# Altium footprint library SparkFun-Retired.PCBLIB: 302 footprints (part 17 of 19)
Each footprint in its own frame and in the unit in brackets; x right, y up, seen from the top. Pads: shape width x height; smd on the part's side, far side on the other; paste and mask are expansions set on the pad; w line width, h text height; cw(c..) or ccw(c..) is an arc to the next point about the centre after c.
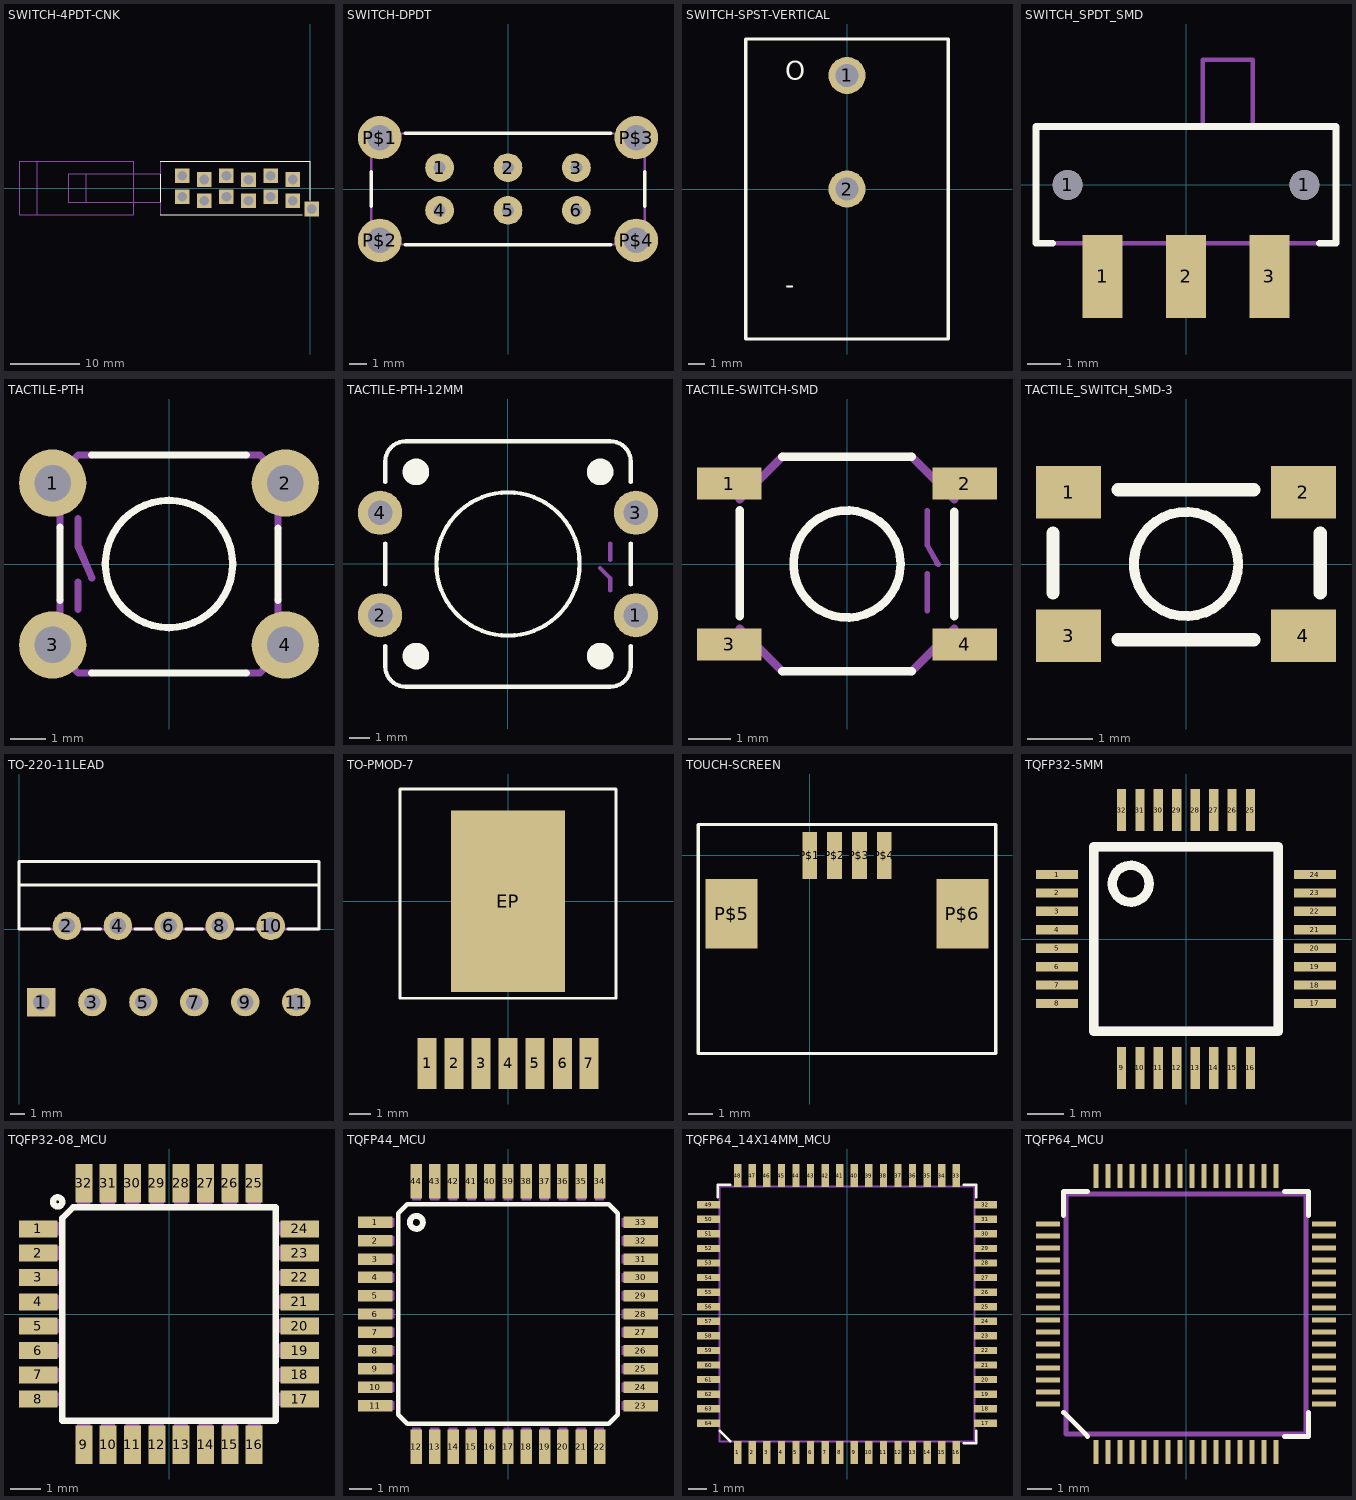
[diagram p16: the footprints below, top view; thin cyan lines are the x and y axes]

## SWITCH-4PDT-CNK [mil]
pads (13):
  rect 82.68x82.68 hole 55.12: P$13(8,-118) PP$1(-725,-49) PP$2(-600,-71) PP$3(-475,-49) PP$4(-350,-71) PP$5(-225,-49) PP$6(-100,-71) PP$7(-725,71) PP$8(-600,49) PP$9(-475,71) PP$10(-350,47) PP$11(-225,71) PP$12(-100,49)
Top Overlay:
  lines w5: -850,-150 -46,-150 ; -850,-79 -850,79 ; -850,150 0,150 0,-67
Mechanical 14:
  lines w5: -1272,-79 -1271,-79 ; -850,-150 -850,-79 ; -850,79 -850,150
Mechanical 16:
  rectangle: -745.9,-71.6 -704.9,-48.6
  rectangle: -620.5,-71.6 -579.5,-48.6
  rectangle: -495.1,-71.6 -454.1,-48.6
  rectangle: -369.7,-71.6 -328.7,-48.6
  rectangle: -244.3,-71.6 -203.3,-48.6
  rectangle: -118.9,-71.6 -77.9,-48.6
  rectangle: -745.9,47.9 -704.9,70.9
  rectangle: -620.5,47.9 -579.5,70.9
  rectangle: -495.1,47.9 -454.1,70.9
  rectangle: -369.7,47.9 -328.7,70.9
  rectangle: -244.3,47.9 -203.3,70.9
  rectangle: -118.9,47.9 -77.9,70.9
  region: 7.5,-138.5 7.5,-97.5 -15.5,-97.5 -15.5,-138.5
  lines w5: -1272,-79 -1272,79 ; -850,-79 -1271,-79 -1370,-79 -1370,79 -1272,79 ; -850,79 -1272,79 ; -1550,-150 -1550,150 ; -1550,-150 -1000,-150 -1000,150 -1550,150 ; -1550,-150 -1650,-150 -1650,150 -1550,150

## SWITCH-DPDT [mil]
pads (10):
  round 66 hole 27.56: 1(-157.48,49.21) 2(0,49.21) 3(157.48,49.21) 4(-157.48,-49.21) 5(0,-49.21) 6(157.48,-49.21)
  round 100 hole 59.06: P$1(-295.28,118.11) P$2(-295.28,-118.11) P$3(295.28,118.11) P$4(295.28,-118.11)
Top Overlay:
  lines w8: -314.96,-39.37 -314.96,39.37 ; -236.22,-127.95 236.22,-127.95 ; -236.22,127.95 236.22,127.95 ; 314.96,-39.37 314.96,39.37
Mechanical 16:
  lines w5: -314.96,-127.95 -314.96,127.95 314.96,127.95 314.96,-127.95 -314.96,-127.95

## SWITCH-SPST-VERTICAL [mil]
pads (2):
  round 90 hole 55.12: 1(0,275.59) 2(0,0)
Top Overlay:
  lines w8: -246.06,-364.17 246.06,-364.17 246.06,364.17 -246.06,364.17 -246.06,-364.17
  text "-" at -150,-270 h77.5
  text "O" at -150,250 h77.5
Mechanical 13:
  text "EG2578" at -150,-500 h77.5

## SWITCH_SPDT_SMD [mil]
pads (5):
  round 35.43 hole 35.43: 1(-139.76,0) 1(139.76,0)
  rect 47.24x98.43 smd: 1(-98.43,-108.27) 2(0,-108.27) 3(98.43,-108.27)
Top Overlay:
  lines w8: -157.48,-68.9 -177.17,-68.9 -177.17,68.9 177.17,68.9 177.17,-68.9 157.48,-68.9
Mechanical 16:
  lines w5: 19.69,68.9 78.74,68.9 ; 19.69,68.9 -177.17,68.9 -177.17,-68.9 177.17,-68.9 177.17,68.9 78.74,68.9 ; 19.69,68.9 19.69,147.64 78.74,147.64 78.74,68.9

## TACTILE-PTH [mil]
pads (4):
  round 74 hole 40: 1(-128,89) 2(128,89) 3(-128,-89) 4(128,-89)
Top Overlay:
  circle w8: c0,0 r70
  lines w8: -120,-40 -120,40.47 ; -85,-120 85,-120 ; -85,120 85,120 ; 120,-40 120,39.29
Mechanical 16:
  lines w8: -120,-40 -120,-100 -100,-120 -85,-120 ; -120,40 -120,100 -100,120 -85,120 ; -100,-50 -100,-20 ; -100,50 -100,20 -85,-15 ; 85,-120 100,-120 120,-100 120,-40 ; 85,120 100,120 120,100 120,40

## TACTILE-PTH-12MM [mil]
pads (4):
  round 85 hole 47.24: 1(246.06,-98.43) 2(-246.06,-98.43) 3(246.06,98.43) 4(-246.06,98.43)
Top Overlay:
  circle w8: c0,0 r137.8
  circle w27.56: c-177.17,177.17 r11.81
  circle w27.56: c177.17,177.17 r11.81
  circle w27.56: c177.17,-177.17 r11.81
  circle w27.56: c-177.17,-177.17 r11.81
  lines w8: -236.22,-157.48 -236.22,-196.85 ccw(c-196.85,-196.85) -196.85,-236.22 196.85,-236.22 ccw(c196.85,-196.85) 236.22,-196.85 236.22,-157.48 ; -236.22,-39.37 -236.22,39.37 ; -236.22,157.48 -236.22,196.85 cw(c-196.85,196.85) -196.85,236.22 196.85,236.22 cw(c196.85,196.85) 236.22,196.85 236.22,157.48 ; 236.22,-39.37 236.22,39.37
Mechanical 16:
  lines w8: 177.17,-7.87 196.85,-27.56 196.85,-51.18 ; 196.85,7.87 196.85,39.37

## TACTILE-SWITCH-SMD [mil]
pads (4):
  rect 60x30 smd: 1(-110,75) 2(110,75) 3(-110,-75) 4(110,-75)
Top Overlay:
  circle w8: c0,0 r50
  lines w8: -100,-48.82 -100,50 ; -60.63,-100 60.63,-100 ; -60.63,100 60.63,100 ; 100,-48.82 100,48.82
Mechanical 16:
  lines w5: 75,-43.9 75,-9.06 ; 75,50 75,17.52 85.04,-0.39
  lines w8: -100,-60.63 -60.63,-100 ; -100,60.63 -60.63,100 ; 60.63,-100 100,-60.63 ; 60.63,100 100,60.63

## TACTILE_SWITCH_SMD-3 [mil]
pads (4):
  rect 39.37x31.5 smd: 1(-70.87,43.31) 2(70.87,43.31) 3(-70.87,-43.31) 4(70.87,-43.31)
Top Overlay:
  circle w5.91: c0,0 r31.5
  lines w8: -80.32,-17.32 -80.32,18.5 ; -40.94,-45.67 40.94,-45.67 ; -40.94,44.88 40.94,44.88 ; 81.1,-17.32 81.1,18.5

## TO-220-11LEAD [mm]
pads (11):
  rect 1.9x1.9 hole 1.1: 1(1.5,-4.87)
  round 1.9 hole 1.1: 2(3.2,0.21) 3(4.9,-4.87) 4(6.6,0.21) 5(8.3,-4.87) 6(10,0.21) 7(11.7,-4.87) 8(13.4,0.21) 9(15.1,-4.87) 10(16.8,0.21) 11(18.5,-4.87)
Top Overlay:
  lines w0.203: 2.05,0 0,0 0,2.95 ; 4.35,0 5.45,0 ; 7.75,0 8.85,0 ; 11.15,0 12.25,0 ; 14.55,0 15.65,0 ; 17.95,0 20,0 ; 20.02,0 20.02,2.95 ; 0,2.95 0,4.5 20.02,4.5 20.02,2.95 ; 0,2.95 20.02,2.95
Mechanical 16:
  lines w0.203: 0,0 20.02,0

## TO-PMOD-7 [mm]
pads (8):
  rect 0.89x2.41 smd: 1(-3.81,-7.63) 2(-2.54,-7.63) 3(-1.27,-7.63) 4(0,-7.63) 5(1.27,-7.63) 6(2.57,-7.63) 7(3.81,-7.63)
  rect 5.35x8.54 smd: EP(0,0)
Top Overlay:
  lines w0.127: -5.08,-4.57 -5.08,5.28 5.08,5.28 5.08,-4.57 -5.08,-4.57

## TOUCH-SCREEN [mm]
pads (6):
  rect 0.6x1.9 smd: P$1(0,0) P$2(1,0) P$3(2,0) P$4(3,0)
  rect 2.1x2.8 smd: P$5(-3.15,-2.35) P$6(6.15,-2.35)
Top Overlay:
  lines w0.127: -4.5,-8 7.5,-8 7.5,1.25 -4.5,1.25 -4.5,-8

## TQFP32-5MM [mil]
pads (32):
  rect 45x10 smd: 1(-137.8,68.9) 2(-137.8,49.21) 3(-137.8,29.53) 4(-137.8,9.84) 5(-137.8,-9.84) 6(-137.8,-29.53) 7(-137.8,-49.21) 8(-137.8,-68.9) 17(137.8,-68.9) 18(137.8,-49.21) 19(137.8,-29.53) 20(137.8,-9.84) 21(137.8,9.84) 22(137.8,29.53) 23(137.8,49.21) 24(137.8,68.9)
  rect 10x45 smd: 9(-68.9,-137.8) 10(-49.21,-137.8) 11(-29.53,-137.8) 12(-9.84,-137.8) 13(9.84,-137.8) 14(29.53,-137.8) 15(49.21,-137.8) 16(68.9,-137.8) 25(68.9,137.8) 26(49.21,137.8) 27(29.53,137.8) 28(9.84,137.8) 29(-9.84,137.8) 30(-29.53,137.8) 31(-49.21,137.8) 32(-68.9,137.8)
Top Overlay:
  circle w10: c-59.06,59.06 r19.69
  lines w10: -98.43,-98.43 98.43,-98.43 98.43,98.43 -98.43,98.43 -98.43,-98.43
Mechanical 16:
  lines w10: -98.43,-98.43 98.43,-98.43 98.43,98.43 -98.43,98.43 -98.43,-98.43

## TQFP32-08_MCU [mil]
pads (32):
  rect 50x22 smd: 1(-169,110.24) 2(-169,78.74) 3(-169,47.24) 4(-169,15.75) 5(-169,-15.75) 6(-169,-47.24) 7(-169,-78.74) 8(-169,-110.24) 17(169,-110.24) 18(169,-78.74) 19(169,-47.24) 20(169,-15.75) 21(169,15.75) 22(169,47.24) 23(169,78.74) 24(169,110.24)
  rect 22x50 smd: 9(-110.24,-169) 10(-78.74,-169) 11(-47.24,-169) 12(-15.75,-169) 13(15.75,-169) 14(47.24,-169) 15(78.74,-169) 16(110.24,-169) 25(110.24,169) 26(78.74,169) 27(47.24,169) 28(15.75,169) 29(-15.75,169) 30(-47.24,169) 31(-78.74,169) 32(-110.24,169)
Top Overlay:
  circle w8: c-144,145 r6
  lines w8: -137.99,-137.99 137.99,-137.99 137.99,137.99 -124.02,137.99 -137.99,124.02 -137.99,-137.99
Mechanical 16:
  rectangle: -179,101.24 -140,119.24
  rectangle: -179,69.74 -140,87.74
  rectangle: -179,38.24 -140,56.24
  rectangle: -179,6.75 -140,24.75
  rectangle: -179,-24.75 -140,-6.75
  rectangle: -179,-56.24 -140,-38.24
  rectangle: -179,-87.74 -140,-69.74
  rectangle: -179,-119.24 -140,-101.24
  rectangle: -119.24,-179 -101.24,-140
  rectangle: -87.74,-179 -69.74,-140
  rectangle: -56.24,-179 -38.24,-140
  rectangle: -24.75,-179 -6.75,-140
  rectangle: 6.75,-179 24.75,-140
  rectangle: 38.24,-179 56.24,-140
  rectangle: 69.74,-179 87.74,-140
  rectangle: 101.24,-179 119.24,-140
  rectangle: 140,-119.24 179,-101.24
  rectangle: 140,-87.74 179,-69.74
  rectangle: 140,-56.24 179,-38.24
  rectangle: 140,-24.75 179,-6.75
  rectangle: 140,6.75 179,24.75
  rectangle: 140,38.24 179,56.24
  rectangle: 140,69.74 179,87.74
  rectangle: 140,101.24 179,119.24
  rectangle: 101.24,140 119.24,179
  rectangle: 69.74,140 87.74,179
  rectangle: 38.24,140 56.24,179
  rectangle: 6.75,140 24.75,179
  rectangle: -24.75,140 -6.75,179
  rectangle: -56.24,140 -38.24,179
  rectangle: -87.74,140 -69.74,179
  rectangle: -119.24,140 -101.24,179

## TQFP44_MCU [mil]
pads (44):
  rect 59.06x19.69 smd: 1(-228.35,157.48) 2(-228.35,125.98) 3(-228.35,94.49) 4(-228.35,62.99) 5(-228.35,31.5) 6(-228.35,0) 7(-228.35,-31.5) 8(-228.35,-62.99) 9(-228.35,-94.49) 10(-228.35,-125.98) 11(-228.35,-157.48) 23(228.35,-157.48) 24(228.35,-125.98) 25(228.35,-94.49) 26(228.35,-62.99) 27(228.35,-31.5) 28(228.35,0) 29(228.35,31.5) 30(228.35,62.99) 31(228.35,94.49) 32(228.35,125.98) 33(228.35,157.48)
  rect 19.69x59.06 smd: 12(-157.48,-228.35) 13(-125.98,-228.35) 14(-94.49,-228.35) 15(-62.99,-228.35) 16(-31.5,-228.35) 17(0,-228.35) 18(31.5,-228.35) 19(62.99,-228.35) 20(94.49,-228.35) 21(125.98,-228.35) 22(157.48,-228.35) 34(157.48,228.35) 35(125.98,228.35) 36(94.49,228.35) 37(62.99,228.35) 38(31.5,228.35) 39(0,228.35) 40(-31.5,228.35) 41(-62.99,228.35) 42(-94.49,228.35) 43(-125.98,228.35) 44(-157.48,228.35)
Top Overlay:
  circle w10: c-157.48,157.48 r11.13
  lines w8: -188.98,-173.23 -173.23,-188.98 173.23,-188.98 188.98,-173.23 188.98,173.23 173.23,188.98 -173.23,188.98 -188.98,173.23 -188.98,-173.23
Mechanical 16:
  rectangle: -240.16,149.61 -194.88,165.35
  rectangle: -240.16,118.11 -194.88,133.86
  rectangle: -240.16,86.61 -194.88,102.36
  rectangle: -240.16,55.12 -194.88,70.87
  rectangle: -240.16,23.62 -194.88,39.37
  rectangle: -240.16,-7.87 -194.88,7.87
  rectangle: -240.16,-39.37 -194.88,-23.62
  rectangle: -240.16,-70.87 -194.88,-55.12
  rectangle: -240.16,-102.36 -194.88,-86.61
  rectangle: -240.16,-133.86 -194.88,-118.11
  rectangle: -240.16,-165.35 -194.88,-149.61
  rectangle: -165.35,-240.16 -149.61,-194.88
  rectangle: -133.86,-240.16 -118.11,-194.88
  rectangle: -102.36,-240.16 -86.61,-194.88
  rectangle: -70.87,-240.16 -55.12,-194.88
  rectangle: -39.37,-240.16 -23.62,-194.88
  rectangle: -7.87,-240.16 7.87,-194.88
  rectangle: 23.62,-240.16 39.37,-194.88
  rectangle: 55.12,-240.16 70.87,-194.88
  rectangle: 86.61,-240.16 102.36,-194.88
  rectangle: 118.11,-240.16 133.86,-194.88
  rectangle: 149.61,-240.16 165.35,-194.88
  rectangle: 194.88,-165.35 240.16,-149.61
  rectangle: 194.88,-133.86 240.16,-118.11
  rectangle: 194.88,-102.36 240.16,-86.61
  rectangle: 194.88,-70.87 240.16,-55.12
  rectangle: 194.88,-39.37 240.16,-23.62
  rectangle: 194.88,-7.87 240.16,7.87
  rectangle: 194.88,23.62 240.16,39.37
  rectangle: 194.88,55.12 240.16,70.87
  rectangle: 194.88,86.61 240.16,102.36
  rectangle: 194.88,118.11 240.16,133.86
  rectangle: 194.88,149.61 240.16,165.35
  rectangle: 149.61,194.88 165.35,240.16
  rectangle: 118.11,194.88 133.86,240.16
  rectangle: 86.61,194.88 102.36,240.16
  rectangle: 55.12,194.88 70.87,240.16
  rectangle: 23.62,194.88 39.37,240.16
  rectangle: -7.87,194.88 7.87,240.16
  rectangle: -39.37,194.88 -23.62,240.16
  rectangle: -70.87,194.88 -55.12,240.16
  rectangle: -102.36,194.88 -86.61,240.16
  rectangle: -133.86,194.88 -118.11,240.16
  rectangle: -165.35,194.88 -149.61,240.16

## TQFP64_14X14MM_MCU [mm]
pads (64):
  rect 0.4x1.27 smd: 1(-6,-7.6) 2(-5.2,-7.6) 3(-4.4,-7.6) 4(-3.6,-7.6) 5(-2.8,-7.6) 6(-2,-7.6) 7(-1.2,-7.6) 8(-0.4,-7.6) 9(0.4,-7.6) 10(1.2,-7.6) 11(2,-7.6) 12(2.8,-7.6) 13(3.6,-7.6) 14(4.4,-7.6) 15(5.2,-7.6) 16(6,-7.6) 33(6,7.6) 34(5.2,7.6) 35(4.4,7.6) 36(3.6,7.6) 37(2.8,7.6) 38(2,7.6) 39(1.2,7.6) 40(0.4,7.6) 41(-0.4,7.6) 42(-1.2,7.6) 43(-2,7.6) 44(-2.8,7.6) 45(-3.6,7.6) 46(-4.4,7.6) 47(-5.2,7.6) 48(-6,7.6)
  rect 1.27x0.4 smd: 17(7.6,-6) 18(7.6,-5.2) 19(7.6,-4.4) 20(7.6,-3.6) 21(7.6,-2.8) 22(7.6,-2) 23(7.6,-1.2) 24(7.6,-0.4) 25(7.6,0.4) 26(7.6,1.2) 27(7.6,2) 28(7.6,2.8) 29(7.6,3.6) 30(7.6,4.4) 31(7.6,5.2) 32(7.6,6) 49(-7.6,6) 50(-7.6,5.2) 51(-7.6,4.4) 52(-7.6,3.6) 53(-7.6,2.8) 54(-7.6,2) 55(-7.6,1.2) 56(-7.6,0.4) 57(-7.6,-0.4) 58(-7.6,-1.2) 59(-7.6,-2) 60(-7.6,-2.8) 61(-7.6,-3.6) 62(-7.6,-4.4) 63(-7.6,-5.2) 64(-7.6,-6)
Top Overlay:
  lines w0.127: -7.1,6.4 -7.1,7.1 -6.4,7.1 ; -7,-6.4 -6.4,-7 ; 6.4,-7.1 7.1,-7.1 7.1,-6.4 ; 6.4,7.1 7.1,7.1 7.1,6.4
Mechanical 16:
  lines w0.127: -7,-7 -7,7 7,7 7,-7 -7,-7

## TQFP64_MCU [mm]
pads (64):
  rect 0.22x1 smd: 1(-3.75,-5.75) 2(-3.25,-5.75) 3(-2.75,-5.75) 4(-2.25,-5.75) 5(-1.75,-5.75) 6(-1.25,-5.75) 7(-0.75,-5.75) 8(-0.25,-5.75) 9(0.25,-5.75) 10(0.75,-5.75) 11(1.25,-5.75) 12(1.75,-5.75) 13(2.25,-5.75) 14(2.75,-5.75) 15(3.25,-5.75) 16(3.75,-5.75) 33(3.75,5.75) 34(3.25,5.75) 35(2.75,5.75) 36(2.25,5.75) 37(1.75,5.75) 38(1.25,5.75) 39(0.75,5.75) 40(0.25,5.75) 41(-0.25,5.75) 42(-0.75,5.75) 43(-1.25,5.75) 44(-1.75,5.75) 45(-2.25,5.75) 46(-2.75,5.75) 47(-3.25,5.75) 48(-3.75,5.75)
  rect 1x0.22 smd: 17(5.75,-3.75) 18(5.75,-3.25) 19(5.75,-2.75) 20(5.75,-2.25) 21(5.75,-1.75) 22(5.75,-1.25) 23(5.75,-0.75) 24(5.75,-0.25) 25(5.75,0.25) 26(5.75,0.75) 27(5.75,1.25) 28(5.75,1.75) 29(5.75,2.25) 30(5.75,2.75) 31(5.75,3.25) 32(5.75,3.75) 49(-5.75,3.75) 50(-5.75,3.25) 51(-5.75,2.75) 52(-5.75,2.25) 53(-5.75,1.75) 54(-5.75,1.25) 55(-5.75,0.75) 56(-5.75,0.25) 57(-5.75,-0.25) 58(-5.75,-0.75) 59(-5.75,-1.25) 60(-5.75,-1.75) 61(-5.75,-2.25) 62(-5.75,-2.75) 63(-5.75,-3.25) 64(-5.75,-3.75)
Top Overlay:
  lines w0.203: -5.1,-4.1 -4.1,-5.1 ; -5.1,4.1 -5.1,5.1 -4.1,5.1 ; 4.1,-5.1 5.1,-5.1 5.1,-4.1 ; 4.1,5.1 5.1,5.1 5.1,4.1
Mechanical 16:
  lines w0.203: -5,-5 5,-5 5,5 -5,5 -5,-5